# Altium integrated library LEMO Unipole And Multipole Type Connectors.IntLib: 1566 symbols (part 5 of 13) (continued)
## EXA.1B.307.HLN
designator J?
Elbow receptacle for printed circuit with two nuts (solder or screw fixing, back panel mounting), Key (A), 1B series, Multipole Type with 7 Contacts; Manufacturer: LEMO; PartNumber: EXA.1B.307.HLN; Number of contacts: 7; Contact Diameter: 0.7 mm; AWG: 24; Rated Current(A): 6; DatasheetVersion: Jun-14; PackageReference: EXA.1B.307.HLN; PackageDescription: Elbow receptacle for printed circuit with two nuts (solder or screw fixing, back panel mounting), Key(A) for Printed Circuit; Supplier 1: Mouser; Supplier Part Number 1: 736-EXA1B307HLN; Supplier 2: Digi-Key; Supplier Part Number 2: EXA.1B.307.HLN-ND; ComponentLink1Description: Manufacturer URL; ComponentLink1URL: http://www.lemo.com; ComponentLink2Description: Datasheet; ComponentLink2URL: http://intra.lemo.ch/catalog/ROW/UK_English/unipole_multipole.pdf
footprint EXA.1B.307.HLN (Socket, Female, Body 11mm dia. Height 14 mm, Through hole)
pins: 1, 2, 3, 4, 5, 6, 7, 9, 10, 11, 12

## EXA.1B.308.HLN
designator J?
Elbow receptacle for printed circuit with two nuts (solder or screw fixing, back panel mounting), Key (A), 1B series, Multipole Type with 8 Contacts; Manufacturer: LEMO; PartNumber: EXA.1B.308.HLN; Number of contacts: 8; Contact Diameter: 0.7 mm; AWG: 24; Rated Current(A): 2; DatasheetVersion: Jun-14; PackageReference: EXA.1B.308.HLN; PackageDescription: Elbow receptacle for printed circuit with two nuts (solder or screw fixing, back panel mounting), Key(A) for Printed Circuit; Supplier 1: Mouser; Supplier Part Number 1: 736-EXA1B308HLN; Supplier 2: Digi-Key; Supplier Part Number 2: EXA.1B.308.HLN-ND; ComponentLink1Description: Manufacturer URL; ComponentLink1URL: http://www.lemo.com; ComponentLink2Description: Datasheet; ComponentLink2URL: http://intra.lemo.ch/catalog/ROW/UK_English/unipole_multipole.pdf
footprint EXA.1B.308.HLN (Socket, Female, Body 11mm dia. Height 14 mm, Through hole)
pins: 1, 2, 3, 4, 5, 6, 7, 8, 10, 11, 12, 13

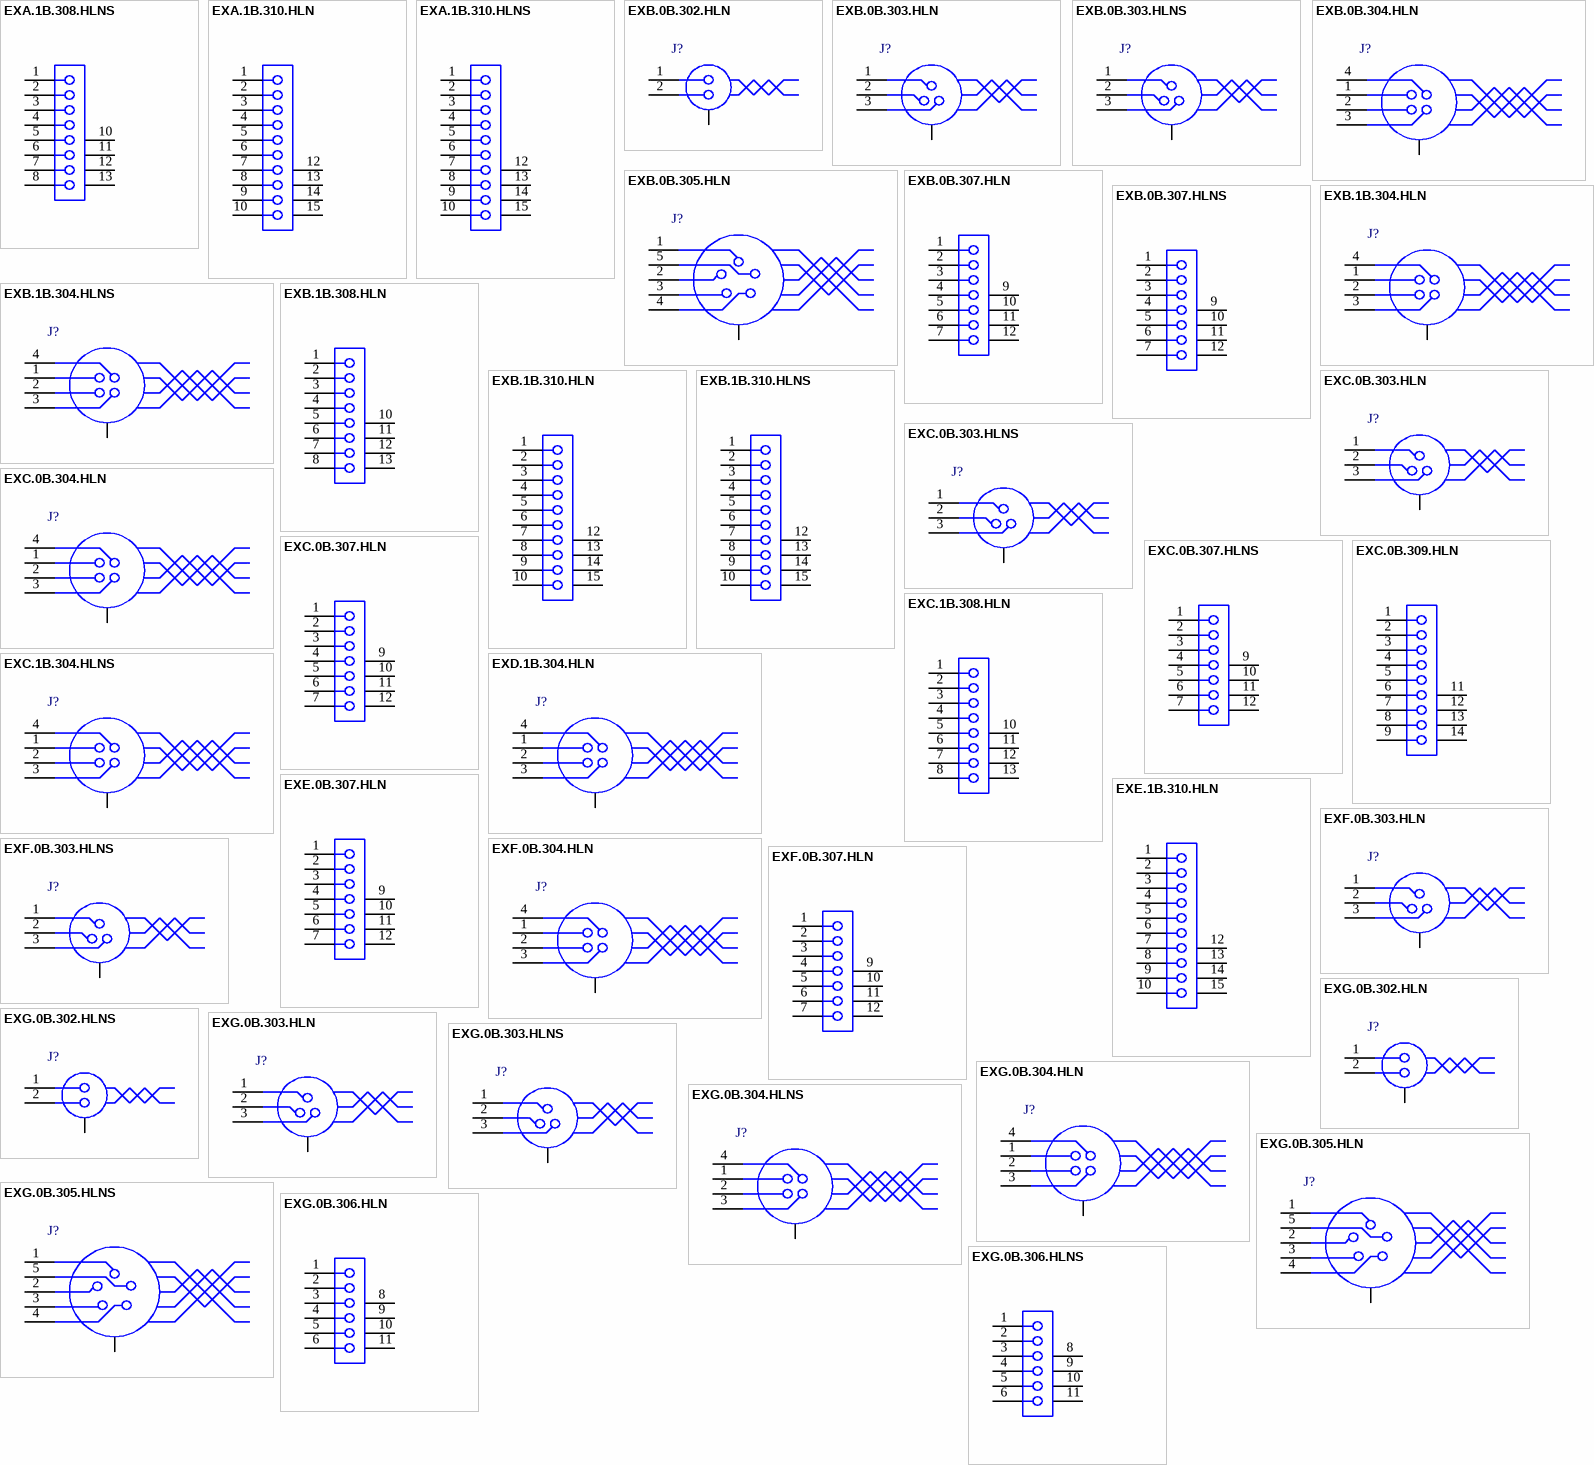
[diagram p16: symbols EXA.1B.308.HLNS to EXG.0B.306.HLNS]

## EXA.1B.308.HLNS
designator J?
Elbow receptacle for printed circuit with two nuts (solder or screw fixing, back panel mounting), Key (A), 1B series, Multipole Type with 8 Contacts; Manufacturer: LEMO; PartNumber: EXA.1B.308.HLNS; Number of contacts: 8; Contact Diameter: 0.7 mm; AWG: 24; Rated Current(A): 2; DatasheetVersion: Jun-14; PackageReference: EXA.1B.308.HLNS; PackageDescription: Elbow receptacle for printed circuit with two nuts (solder or screw fixing, back panel mounting), Key(A) for Printed Circuit; ComponentLink1Description: Manufacturer URL; ComponentLink1URL: http://www.lemo.com; ComponentLink2Description: Datasheet; ComponentLink2URL: http://intra.lemo.ch/catalog/ROW/UK_English/unipole_multipole.pdf
footprint EXA.1B.308.HLNS (Socket, Female, Body 11mm dia. Height 14 mm, Through hole)
pins: 1, 2, 3, 4, 5, 6, 7, 8, 10, 11, 12, 13

## EXA.1B.310.HLN
designator J?
Elbow receptacle for printed circuit with two nuts (solder or screw fixing, back panel mounting), Key (A), 1B series, Multipole Type with 10 Contacts; Manufacturer: LEMO; PartNumber: EXA.1B.310.HLN; Number of contacts: 10; Contact Diameter: 0.5 mm; AWG: 28; Rated Current(A): 1.5.; DatasheetVersion: Jun-14; PackageReference: EXA.1B.310.HLN; PackageDescription: Elbow receptacle for printed circuit with two nuts (solder or screw fixing, back panel mounting), Key(A) for Printed Circuit; ComponentLink1Description: Manufacturer URL; ComponentLink1URL: http://www.lemo.com; ComponentLink2Description: Datasheet; ComponentLink2URL: http://intra.lemo.ch/catalog/ROW/UK_English/unipole_multipole.pdf
footprint EXA.1B.310.HLN (Socket, Female, Body 11mm dia. Height 14 mm, Through hole)
pins: 1, 2, 3, 4, 5, 6, 7, 8, 9, 10, 12, 13, 14, 15

## EXA.1B.310.HLNS
designator J?
Elbow receptacle for printed circuit with two nuts (solder or screw fixing, back panel mounting), Key (A), 1B series, Multipole Type with 10 Contacts; Manufacturer: LEMO; PartNumber: EXA.1B.310.HLNS; Number of contacts: 10; Contact Diameter: 0.5 mm; AWG: 28; Rated Current(A): 1.5.; DatasheetVersion: Jun-14; PackageReference: EXA.1B.310.HLNS; PackageDescription: Elbow receptacle for printed circuit with two nuts (solder or screw fixing, back panel mounting), Key(A) for Printed Circuit; ComponentLink1Description: Manufacturer URL; ComponentLink1URL: http://www.lemo.com; ComponentLink2Description: Datasheet; ComponentLink2URL: http://intra.lemo.ch/catalog/ROW/UK_English/unipole_multipole.pdf
footprint EXA.1B.310.HLNS (Socket, Female, Body 11mm dia. Height 14 mm, Through hole)
pins: 1, 2, 3, 4, 5, 6, 7, 8, 9, 10, 12, 13, 14, 15

## EXB.0B.302.HLN
designator J?
Elbow receptacle for printed circuit with two nuts (solder or screw fixing, back panel mounting), Key (B), 0B series, Multipole Type with 2 Contacts; Manufacturer: LEMO; PartNumber: EXB.0B.302.HLN; Number of contacts: 2; Contact Diameter: 0.9 mm; AWG: 22; Rated Current(A): 6; DatasheetVersion: Jun-14; PackageReference: EXB.0B.302.HLN; PackageDescription: Elbow receptacle for printed circuit with two nuts (solder or screw fixing, back panel mounting), Key(B) for Printed Circuit; Supplier 1: Mouser; Supplier Part Number 1: 736-EXB0B302HLN; Supplier 2: Digi-Key; Supplier Part Number 2: EXB.0B.302.HLN-ND; ComponentLink1Description: Manufacturer URL; ComponentLink1URL: http://www.lemo.com; ComponentLink2Description: Datasheet; ComponentLink2URL: http://intra.lemo.ch/catalog/ROW/UK_English/unipole_multipole.pdf
footprint EXB.0B.302.HLN (Socket, Female, Body 9mm dia. Height 10.5 mm, Through hole)
pins: 1, 2, 4, 5, 6, 7

## EXB.0B.303.HLN
designator J?
Elbow receptacle for printed circuit with two nuts (solder or screw fixing, back panel mounting), Key (B), 0B series, Multipole Type with 3 Contacts; Manufacturer: LEMO; PartNumber: EXB.0B.303.HLN; Number of contacts: 3; Contact Diameter: 0.9 mm; AWG: 22; Rated Current(A): 6; DatasheetVersion: Jun-14; PackageReference: EXB.0B.303.HLN; PackageDescription: Elbow receptacle for printed circuit with two nuts (solder or screw fixing, back panel mounting), Key(B) for Printed Circuit; ComponentLink1Description: Manufacturer URL; ComponentLink1URL: http://www.lemo.com; ComponentLink2Description: Datasheet; ComponentLink2URL: http://intra.lemo.ch/catalog/ROW/UK_English/unipole_multipole.pdf
footprint EXB.0B.303.HLN (Socket, Female, Body 9mm dia. Height 10.5 mm, Through hole)
pins: 1, 2, 3, 5, 6, 7, 8

## EXB.0B.303.HLNS
designator J?
Elbow receptacle for printed circuit with two nuts (solder or screw fixing, back panel mounting), Key (B), 0B series, Multipole Type with 3 Contacts; Manufacturer: LEMO; PartNumber: EXB.0B.303.HLNS; Number of contacts: 3; Contact Diameter: 0.9 mm; AWG: 22; Rated Current(A): 6; DatasheetVersion: Jun-14; PackageReference: EXB.0B.303.HLNS; PackageDescription: Elbow receptacle for printed circuit with two nuts (solder or screw fixing, back panel mounting), Key(B) for Printed Circuit; ComponentLink1Description: Manufacturer URL; ComponentLink1URL: http://www.lemo.com; ComponentLink2Description: Datasheet; ComponentLink2URL: http://intra.lemo.ch/catalog/ROW/UK_English/unipole_multipole.pdf
footprint EXB.0B.303.HLNS (Socket, Female, Body 9mm dia. Height 10.5 mm, Through hole)
pins: 1, 2, 3, 5, 6, 7, 8

## EXB.0B.304.HLN
designator J?
Elbow receptacle for printed circuit with two nuts (solder or screw fixing, back panel mounting), Key (B), 0B series, Multipole Type with 4 Contacts; Manufacturer: LEMO; PartNumber: EXB.0B.304.HLN; Number of contacts: 4; Contact Diameter: 0.7 mm; AWG: 24; Rated Current(A): 6; DatasheetVersion: Jun-14; PackageReference: EXB.0B.304.HLN; PackageDescription: Elbow receptacle for printed circuit with two nuts (solder or screw fixing, back panel mounting), Key(B) for Printed Circuit; Supplier 1: Mouser; Supplier Part Number 1: 736-EXB0B304HLN; Supplier 2: Digi-Key; Supplier Part Number 2: EXB.0B.304.HLN-ND; ComponentLink1Description: Manufacturer URL; ComponentLink1URL: http://www.lemo.com; ComponentLink2Description: Datasheet; ComponentLink2URL: http://intra.lemo.ch/catalog/ROW/UK_English/unipole_multipole.pdf
footprint EXB.0B.304.HLN (Socket, Female, Body 9mm dia. Height 10.5 mm, Through hole)
pins: 1, 2, 3, 4, 6, 7, 8, 9

## EXB.0B.305.HLN
designator J?
Elbow receptacle for printed circuit with two nuts (solder or screw fixing, back panel mounting), Key (B), 0B series, Multipole Type with 5 Contacts; Manufacturer: LEMO; PartNumber: EXB.0B.305.HLN; Number of contacts: 5; Contact Diameter: 0.7 mm; AWG: 24; Rated Current(A): 6; DatasheetVersion: Jun-14; PackageReference: EXB.0B.305.HLN; PackageDescription: Elbow receptacle for printed circuit with two nuts (solder or screw fixing, back panel mounting), Key(B) for Printed Circuit; Supplier 1: Mouser; Supplier Part Number 1: 736-EXB0B305HLN; Supplier 2: Digi-Key; Supplier Part Number 2: EXB.0B.305.HLN-ND; ComponentLink1Description: Manufacturer URL; ComponentLink1URL: http://www.lemo.com; ComponentLink2Description: Datasheet; ComponentLink2URL: http://intra.lemo.ch/catalog/ROW/UK_English/unipole_multipole.pdf
footprint EXB.0B.305.HLN (Socket, Female, Body 9mm dia. Height 10.5 mm, Through hole)
pins: 1, 2, 3, 4, 5, 7, 8, 9, 10

## EXB.0B.307.HLN
designator J?
Elbow receptacle for printed circuit with two nuts (solder or screw fixing, back panel mounting), Key (B), 0B series, Multipole Type with 7 Contacts; Manufacturer: LEMO; PartNumber: EXB.0B.307.HLN; Number of contacts: 7; Contact Diameter: 0.5 mm; AWG: 28; Rated Current(A): 2; DatasheetVersion: Jun-14; PackageReference: EXB.0B.307.HLN; PackageDescription: Elbow receptacle for printed circuit with two nuts (solder or screw fixing, back panel mounting), Key(B) for Printed Circuit; ComponentLink1Description: Manufacturer URL; ComponentLink1URL: http://www.lemo.com; ComponentLink2Description: Datasheet; ComponentLink2URL: http://intra.lemo.ch/catalog/ROW/UK_English/unipole_multipole.pdf
footprint EXB.0B.307.HLN (Socket, Female, Body 9mm dia. Height 10.5 mm, Through hole)
pins: 1, 2, 3, 4, 5, 6, 7, 9, 10, 11, 12

## EXB.0B.307.HLNS
designator J?
Elbow receptacle for printed circuit with two nuts (solder or screw fixing, back panel mounting), Key (B), 0B series, Multipole Type with 7 Contacts; Manufacturer: LEMO; PartNumber: EXB.0B.307.HLNS; Number of contacts: 7; Contact Diameter: 0.5 mm; AWG: 28; Rated Current(A): 2; DatasheetVersion: Jun-14; PackageReference: EXB.0B.307.HLNS; PackageDescription: Elbow receptacle for printed circuit with two nuts (solder or screw fixing, back panel mounting), Key(B) for Printed Circuit; Supplier 1: Mouser; Supplier Part Number 1: 736-EXB0B307HLNS; Supplier 2: Digi-Key; Supplier Part Number 2: EXB.0B.307.HLNS-ND; ComponentLink1Description: Manufacturer URL; ComponentLink1URL: http://www.lemo.com; ComponentLink2Description: Datasheet; ComponentLink2URL: http://intra.lemo.ch/catalog/ROW/UK_English/unipole_multipole.pdf
footprint EXB.0B.307.HLNS (Socket, Female, Body 9mm dia. Height 10.5 mm, Through hole)
pins: 1, 2, 3, 4, 5, 6, 7, 9, 10, 11, 12

## EXB.1B.304.HLN
designator J?
Elbow receptacle for printed circuit with two nuts (solder or screw fixing, back panel mounting), Key (B), 1B series, Multipole Type with 4 Contacts; Manufacturer: LEMO; PartNumber: EXB.1B.304.HLN; Number of contacts: 4; Contact Diameter: 0.9 mm; AWG: 22; Rated Current(A): 6; DatasheetVersion: Jun-14; PackageReference: EXB.1B.304.HLN; PackageDescription: Elbow receptacle for printed circuit with two nuts (solder or screw fixing, back panel mounting), Key(B) for Printed Circuit; Supplier 1: Mouser; Supplier Part Number 1: 736-EXB1B304HLN; Supplier 2: Digi-Key; Supplier Part Number 2: EXB.1B.304.HLN-ND; ComponentLink1Description: Manufacturer URL; ComponentLink1URL: http://www.lemo.com; ComponentLink2Description: Datasheet; ComponentLink2URL: http://intra.lemo.ch/catalog/ROW/UK_English/unipole_multipole.pdf
footprint EXB.1B.304.HLN (Socket, Female, Body 11mm dia. Height 14 mm, Through hole)
pins: 1, 2, 3, 4, 6, 7, 8, 9

## EXB.1B.304.HLNS
designator J?
Elbow receptacle for printed circuit with two nuts (solder or screw fixing, back panel mounting), Key (B), 1B series, Multipole Type with 4 Contacts; Manufacturer: LEMO; PartNumber: EXB.1B.304.HLNS; Number of contacts: 4; Contact Diameter: 0.9 mm; AWG: 22; Rated Current(A): 6; DatasheetVersion: Jun-14; PackageReference: EXB.1B.304.HLNS; PackageDescription: Elbow receptacle for printed circuit with two nuts (solder or screw fixing, back panel mounting), Key(B) for Printed Circuit; ComponentLink1Description: Manufacturer URL; ComponentLink1URL: http://www.lemo.com; ComponentLink2Description: Datasheet; ComponentLink2URL: http://intra.lemo.ch/catalog/ROW/UK_English/unipole_multipole.pdf
footprint EXB.1B.304.HLNS (Socket, Female, Body 11mm dia. Height 14 mm, Through hole)
pins: 1, 2, 3, 4, 6, 7, 8, 9

## EXB.1B.308.HLN
designator J?
Elbow receptacle for printed circuit with two nuts (solder or screw fixing, back panel mounting), Key (B), 1B series, Multipole Type with 8 Contacts; Manufacturer: LEMO; PartNumber: EXB.1B.308.HLN; Number of contacts: 8; Contact Diameter: 0.7 mm; AWG: 24; Rated Current(A): 2; DatasheetVersion: Jun-14; PackageReference: EXB.1B.308.HLN; PackageDescription: Elbow receptacle for printed circuit with two nuts (solder or screw fixing, back panel mounting), Key(B) for Printed Circuit; Supplier 1: Mouser; Supplier Part Number 1: 736-EXB1B308HLN; Supplier 2: Digi-Key; Supplier Part Number 2: EXB.1B.308.HLN-ND; ComponentLink1Description: Manufacturer URL; ComponentLink1URL: http://www.lemo.com; ComponentLink2Description: Datasheet; ComponentLink2URL: http://intra.lemo.ch/catalog/ROW/UK_English/unipole_multipole.pdf
footprint EXB.1B.308.HLN (Socket, Female, Body 11mm dia. Height 14 mm, Through hole)
pins: 1, 2, 3, 4, 5, 6, 7, 8, 10, 11, 12, 13

## EXB.1B.310.HLN
designator J?
Elbow receptacle for printed circuit with two nuts (solder or screw fixing, back panel mounting), Key (B), 1B series, Multipole Type with 10 Contacts; Manufacturer: LEMO; PartNumber: EXB.1B.310.HLN; Number of contacts: 10; Contact Diameter: 0.5 mm; AWG: 28; Rated Current(A): 1.5.; DatasheetVersion: Jun-14; PackageReference: EXB.1B.310.HLN; PackageDescription: Elbow receptacle for printed circuit with two nuts (solder or screw fixing, back panel mounting), Key(B) for Printed Circuit; ComponentLink1Description: Manufacturer URL; ComponentLink1URL: http://www.lemo.com; ComponentLink2Description: Datasheet; ComponentLink2URL: http://intra.lemo.ch/catalog/ROW/UK_English/unipole_multipole.pdf
footprint EXB.1B.310.HLN (Socket, Female, Body 11mm dia. Height 14 mm, Through hole)
pins: 1, 2, 3, 4, 5, 6, 7, 8, 9, 10, 12, 13, 14, 15

## EXB.1B.310.HLNS
designator J?
Elbow receptacle for printed circuit with two nuts (solder or screw fixing, back panel mounting), Key (B), 1B series, Multipole Type with 10 Contacts; Manufacturer: LEMO; PartNumber: EXB.1B.310.HLNS; Number of contacts: 10; Contact Diameter: 0.5 mm; AWG: 28; Rated Current(A): 1.5.; DatasheetVersion: Jun-14; PackageReference: EXB.1B.310.HLNS; PackageDescription: Elbow receptacle for printed circuit with two nuts (solder or screw fixing, back panel mounting), Key(B) for Printed Circuit; ComponentLink1Description: Manufacturer URL; ComponentLink1URL: http://www.lemo.com; ComponentLink2Description: Datasheet; ComponentLink2URL: http://intra.lemo.ch/catalog/ROW/UK_English/unipole_multipole.pdf
footprint EXB.1B.310.HLNS (Socket, Female, Body 11mm dia. Height 14 mm, Through hole)
pins: 1, 2, 3, 4, 5, 6, 7, 8, 9, 10, 12, 13, 14, 15

## EXC.0B.303.HLN
designator J?
Elbow receptacle for printed circuit with two nuts (solder or screw fixing, back panel mounting), Key (C), 0B series, Multipole Type with 3 Contacts; Manufacturer: LEMO; PartNumber: EXC.0B.303.HLN; Number of contacts: 3; Contact Diameter: 0.9 mm; AWG: 22; Rated Current(A): 6; DatasheetVersion: Jun-14; PackageReference: EXC.0B.303.HLN; PackageDescription: Elbow receptacle for printed circuit with two nuts (solder or screw fixing, back panel mounting), Key(C) for Printed Circuit; ComponentLink1Description: Manufacturer URL; ComponentLink1URL: http://www.lemo.com; ComponentLink2Description: Datasheet; ComponentLink2URL: http://intra.lemo.ch/catalog/ROW/UK_English/unipole_multipole.pdf
footprint EXC.0B.303.HLN (Socket, Female, Body 9mm dia. Height 10.5 mm, Through hole)
pins: 1, 2, 3, 5, 6, 7, 8

## EXC.0B.303.HLNS
designator J?
Elbow receptacle for printed circuit with two nuts (solder or screw fixing, back panel mounting), Key (C), 0B series, Multipole Type with 3 Contacts; Manufacturer: LEMO; PartNumber: EXC.0B.303.HLNS; Number of contacts: 3; Contact Diameter: 0.9 mm; AWG: 22; Rated Current(A): 6; DatasheetVersion: Jun-14; PackageReference: EXC.0B.303.HLNS; PackageDescription: Elbow receptacle for printed circuit with two nuts (solder or screw fixing, back panel mounting), Key(C) for Printed Circuit; ComponentLink1Description: Manufacturer URL; ComponentLink1URL: http://www.lemo.com; ComponentLink2Description: Datasheet; ComponentLink2URL: http://intra.lemo.ch/catalog/ROW/UK_English/unipole_multipole.pdf
footprint EXC.0B.303.HLNS (Socket, Female, Body 9mm dia. Height 10.5 mm, Through hole)
pins: 1, 2, 3, 5, 6, 7, 8

## EXC.0B.304.HLN
designator J?
Elbow receptacle for printed circuit with two nuts (solder or screw fixing, back panel mounting), Key (C), 0B series, Multipole Type with 4 Contacts; Manufacturer: LEMO; PartNumber: EXC.0B.304.HLN; Number of contacts: 4; Contact Diameter: 0.7 mm; AWG: 24; Rated Current(A): 6; DatasheetVersion: Jun-14; PackageReference: EXC.0B.304.HLN; PackageDescription: Elbow receptacle for printed circuit with two nuts (solder or screw fixing, back panel mounting), Key(C) for Printed Circuit; Supplier 1: Mouser; Supplier Part Number 1: 736-EXC0B304HLN; Supplier 2: Digi-Key; Supplier Part Number 2: EXC.0B.304.HLN-ND; ComponentLink1Description: Manufacturer URL; ComponentLink1URL: http://www.lemo.com; ComponentLink2Description: Datasheet; ComponentLink2URL: http://intra.lemo.ch/catalog/ROW/UK_English/unipole_multipole.pdf
footprint EXC.0B.304.HLN (Socket, Female, Body 9mm dia. Height 10.5 mm, Through hole)
pins: 1, 2, 3, 4, 6, 7, 8, 9

## EXC.0B.307.HLN
designator J?
Elbow receptacle for printed circuit with two nuts (solder or screw fixing, back panel mounting), Key (C), 0B series, Multipole Type with 7 Contacts; Manufacturer: LEMO; PartNumber: EXC.0B.307.HLN; Number of contacts: 7; Contact Diameter: 0.5 mm; AWG: 28; Rated Current(A): 2; DatasheetVersion: Jun-14; PackageReference: EXC.0B.307.HLN; PackageDescription: Elbow receptacle for printed circuit with two nuts (solder or screw fixing, back panel mounting), Key(C) for Printed Circuit; ComponentLink1Description: Manufacturer URL; ComponentLink1URL: http://www.lemo.com; ComponentLink2Description: Datasheet; ComponentLink2URL: http://intra.lemo.ch/catalog/ROW/UK_English/unipole_multipole.pdf
footprint EXC.0B.307.HLN (Socket, Female, Body 9mm dia. Height 10.5 mm, Through hole)
pins: 1, 2, 3, 4, 5, 6, 7, 9, 10, 11, 12

## EXC.0B.307.HLNS
designator J?
Elbow receptacle for printed circuit with two nuts (solder or screw fixing, back panel mounting), Key (C), 0B series, Multipole Type with 7 Contacts; Manufacturer: LEMO; PartNumber: EXC.0B.307.HLNS; Number of contacts: 7; Contact Diameter: 0.5 mm; AWG: 28; Rated Current(A): 2; DatasheetVersion: Jun-14; PackageReference: EXC.0B.307.HLNS; PackageDescription: Elbow receptacle for printed circuit with two nuts (solder or screw fixing, back panel mounting), Key(C) for Printed Circuit; ComponentLink1Description: Manufacturer URL; ComponentLink1URL: http://www.lemo.com; ComponentLink2Description: Datasheet; ComponentLink2URL: http://intra.lemo.ch/catalog/ROW/UK_English/unipole_multipole.pdf
footprint EXC.0B.307.HLNS (Socket, Female, Body 9mm dia. Height 10.5 mm, Through hole)
pins: 1, 2, 3, 4, 5, 6, 7, 9, 10, 11, 12

## EXC.0B.309.HLN
designator J?
Elbow receptacle for printed circuit with two nuts (solder or screw fixing, back panel mounting), Key (C), 0B series, Multipole Type with 9 Contacts; Manufacturer: LEMO; PartNumber: EXC.0B.309.HLN; Number of contacts: 9; Contact Diameter: 0.5 mm; AWG: 28; Rated Current(A): 1.5.; DatasheetVersion: Jun-14; PackageReference: EXC.0B.309.HLN; PackageDescription: Elbow receptacle for printed circuit with two nuts (solder or screw fixing, back panel mounting), Key(C) for Printed Circuit; ComponentLink1Description: Manufacturer URL; ComponentLink1URL: http://www.lemo.com; ComponentLink2Description: Datasheet; ComponentLink2URL: http://intra.lemo.ch/catalog/ROW/UK_English/unipole_multipole.pdf
footprint EXC.0B.309.HLN (Socket, Female, Body 9mm dia. Height 10.5 mm, Through hole)
pins: 1, 2, 3, 4, 5, 6, 7, 8, 9, 11, 12, 13, 14

## EXC.1B.304.HLNS
designator J?
Elbow receptacle for printed circuit with two nuts (solder or screw fixing, back panel mounting), Key (C), 1B series, Multipole Type with 4 Contacts; Manufacturer: LEMO; PartNumber: EXC.1B.304.HLNS; Number of contacts: 4; Contact Diameter: 0.9 mm; AWG: 22; Rated Current(A): 6; DatasheetVersion: Jun-14; PackageReference: EXC.1B.304.HLNS; PackageDescription: Elbow receptacle for printed circuit with two nuts (solder or screw fixing, back panel mounting), Key(C) for Printed Circuit; ComponentLink1Description: Manufacturer URL; ComponentLink1URL: http://www.lemo.com; ComponentLink2Description: Datasheet; ComponentLink2URL: http://intra.lemo.ch/catalog/ROW/UK_English/unipole_multipole.pdf
footprint EXC.1B.304.HLNS (Socket, Female, Body 11mm dia. Height 14 mm, Through hole)
pins: 1, 2, 3, 4, 6, 7, 8, 9

## EXC.1B.308.HLN
designator J?
Elbow receptacle for printed circuit with two nuts (solder or screw fixing, back panel mounting), Key (C), 1B series, Multipole Type with 8 Contacts; Manufacturer: LEMO; PartNumber: EXC.1B.308.HLN; Number of contacts: 8; Contact Diameter: 0.7 mm; AWG: 24; Rated Current(A): 2; DatasheetVersion: Jun-14; PackageReference: EXC.1B.308.HLN; PackageDescription: Elbow receptacle for printed circuit with two nuts (solder or screw fixing, back panel mounting), Key(C) for Printed Circuit; Supplier 1: Mouser; Supplier Part Number 1: 736-EXC1B308HLN; Supplier 2: Digi-Key; Supplier Part Number 2: EXC.1B.308.HLN-ND; ComponentLink1Description: Manufacturer URL; ComponentLink1URL: http://www.lemo.com; ComponentLink2Description: Datasheet; ComponentLink2URL: http://intra.lemo.ch/catalog/ROW/UK_English/unipole_multipole.pdf
footprint EXC.1B.308.HLN (Socket, Female, Body 11mm dia. Height 14 mm, Through hole)
pins: 1, 2, 3, 4, 5, 6, 7, 8, 10, 11, 12, 13

## EXD.1B.304.HLN
designator J?
Elbow receptacle for printed circuit with two nuts (solder or screw fixing, back panel mounting), Key (D), 1B series, Multipole Type with 4 Contacts; Manufacturer: LEMO; PartNumber: EXD.1B.304.HLN; Number of contacts: 4; Contact Diameter: 0.9 mm; AWG: 22; Rated Current(A): 6; DatasheetVersion: Jun-14; PackageReference: EXD.1B.304.HLN; PackageDescription: Elbow receptacle for printed circuit with two nuts (solder or screw fixing, back panel mounting), Key(D) for Printed Circuit; ComponentLink1Description: Manufacturer URL; ComponentLink1URL: http://www.lemo.com; ComponentLink2Description: Datasheet; ComponentLink2URL: http://intra.lemo.ch/catalog/ROW/UK_English/unipole_multipole.pdf
footprint EXD.1B.304.HLN (Socket, Female, Body 11mm dia. Height 14 mm, Through hole)
pins: 1, 2, 3, 4, 6, 7, 8, 9

## EXE.0B.307.HLN
designator J?
Elbow receptacle for printed circuit with two nuts (solder or screw fixing, back panel mounting), Key (E), 0B series, Multipole Type with 7 Contacts; Manufacturer: LEMO; PartNumber: EXE.0B.307.HLN; Number of contacts: 7; Contact Diameter: 0.5 mm; AWG: 28; Rated Current(A): 2; DatasheetVersion: Jun-14; PackageReference: EXE.0B.307.HLN; PackageDescription: Elbow receptacle for printed circuit with two nuts (solder or screw fixing, back panel mounting), Key(E) for Printed Circuit; ComponentLink1Description: Manufacturer URL; ComponentLink1URL: http://www.lemo.com; ComponentLink2Description: Datasheet; ComponentLink2URL: http://intra.lemo.ch/catalog/ROW/UK_English/unipole_multipole.pdf
footprint EXE.0B.307.HLN (Socket, Female, Body 9mm dia. Height 10.5 mm, Through hole)
pins: 1, 2, 3, 4, 5, 6, 7, 9, 10, 11, 12

## EXE.1B.310.HLN
designator J?
Elbow receptacle for printed circuit with two nuts (solder or screw fixing, back panel mounting), Key (E), 1B series, Multipole Type with 10 Contacts; Manufacturer: LEMO; PartNumber: EXE.1B.310.HLN; Number of contacts: 10; Contact Diameter: 0.5 mm; AWG: 28; Rated Current(A): 1.5.; DatasheetVersion: Jun-14; PackageReference: EXE.1B.310.HLN; PackageDescription: Elbow receptacle for printed circuit with two nuts (solder or screw fixing, back panel mounting), Key(E) for Printed Circuit; ComponentLink1Description: Manufacturer URL; ComponentLink1URL: http://www.lemo.com; ComponentLink2Description: Datasheet; ComponentLink2URL: http://intra.lemo.ch/catalog/ROW/UK_English/unipole_multipole.pdf
footprint EXE.1B.310.HLN (Socket, Female, Body 11mm dia. Height 14 mm, Through hole)
pins: 1, 2, 3, 4, 5, 6, 7, 8, 9, 10, 12, 13, 14, 15

## EXF.0B.303.HLN
designator J?
Elbow receptacle for printed circuit with two nuts (solder or screw fixing, back panel mounting), Key (F), 0B series, Multipole Type with 3 Contacts; Manufacturer: LEMO; PartNumber: EXF.0B.303.HLN; Number of contacts: 3; Contact Diameter: 0.9 mm; AWG: 22; Rated Current(A): 6; DatasheetVersion: Jun-14; PackageReference: EXF.0B.303.HLN; PackageDescription: Elbow receptacle for printed circuit with two nuts (solder or screw fixing, back panel mounting), Key(F) for Printed Circuit; ComponentLink1Description: Manufacturer URL; ComponentLink1URL: http://www.lemo.com; ComponentLink2Description: Datasheet; ComponentLink2URL: http://intra.lemo.ch/catalog/ROW/UK_English/unipole_multipole.pdf
footprint EXF.0B.303.HLN (Socket, Female, Body 9mm dia. Height 10.5 mm, Through hole)
pins: 1, 2, 3, 5, 6, 7, 8

## EXF.0B.303.HLNS
designator J?
Elbow receptacle for printed circuit with two nuts (solder or screw fixing, back panel mounting), Key (F), 0B series, Multipole Type with 3 Contacts; Manufacturer: LEMO; PartNumber: EXF.0B.303.HLNS; Number of contacts: 3; Contact Diameter: 0.9 mm; AWG: 22; Rated Current(A): 6; DatasheetVersion: Jun-14; PackageReference: EXF.0B.303.HLNS; PackageDescription: Elbow receptacle for printed circuit with two nuts (solder or screw fixing, back panel mounting), Key(F) for Printed Circuit; ComponentLink1Description: Manufacturer URL; ComponentLink1URL: http://www.lemo.com; ComponentLink2Description: Datasheet; ComponentLink2URL: http://intra.lemo.ch/catalog/ROW/UK_English/unipole_multipole.pdf
footprint EXF.0B.303.HLNS (Socket, Female, Body 9mm dia. Height 10.5 mm, Through hole)
pins: 1, 2, 3, 5, 6, 7, 8

## EXF.0B.304.HLN
designator J?
Elbow receptacle for printed circuit with two nuts (solder or screw fixing, back panel mounting), Key (F), 0B series, Multipole Type with 4 Contacts; Manufacturer: LEMO; PartNumber: EXF.0B.304.HLN; Number of contacts: 4; Contact Diameter: 0.7 mm; AWG: 24; Rated Current(A): 6; DatasheetVersion: Jun-14; PackageReference: EXF.0B.304.HLN; PackageDescription: Elbow receptacle for printed circuit with two nuts (solder or screw fixing, back panel mounting), Key(F) for Printed Circuit; ComponentLink1Description: Manufacturer URL; ComponentLink1URL: http://www.lemo.com; ComponentLink2Description: Datasheet; ComponentLink2URL: http://intra.lemo.ch/catalog/ROW/UK_English/unipole_multipole.pdf
footprint EXF.0B.304.HLN (Socket, Female, Body 9mm dia. Height 10.5 mm, Through hole)
pins: 1, 2, 3, 4, 6, 7, 8, 9

## EXF.0B.307.HLN
designator J?
Elbow receptacle for printed circuit with two nuts (solder or screw fixing, back panel mounting), Key (F), 0B series, Multipole Type with 7 Contacts; Manufacturer: LEMO; PartNumber: EXF.0B.307.HLN; Number of contacts: 7; Contact Diameter: 0.5 mm; AWG: 28; Rated Current(A): 2; DatasheetVersion: Jun-14; PackageReference: EXF.0B.307.HLN; PackageDescription: Elbow receptacle for printed circuit with two nuts (solder or screw fixing, back panel mounting), Key(F) for Printed Circuit; ComponentLink1Description: Manufacturer URL; ComponentLink1URL: http://www.lemo.com; ComponentLink2Description: Datasheet; ComponentLink2URL: http://intra.lemo.ch/catalog/ROW/UK_English/unipole_multipole.pdf
footprint EXF.0B.307.HLN (Socket, Female, Body 9mm dia. Height 10.5 mm, Through hole)
pins: 1, 2, 3, 4, 5, 6, 7, 9, 10, 11, 12

## EXG.0B.302.HLN
designator J?
Elbow receptacle for printed circuit with two nuts (solder or screw fixing, back panel mounting), Key (G), 0B series, Multipole Type with 2 Contacts; Manufacturer: LEMO; PartNumber: EXG.0B.302.HLN; Number of contacts: 2; Contact Diameter: 0.9 mm; AWG: 22; Rated Current(A): 6; DatasheetVersion: Jun-14; PackageReference: EXG.0B.302.HLN; PackageDescription: Elbow receptacle for printed circuit with two nuts (solder or screw fixing, back panel mounting), Key(G) for Printed Circuit; Supplier 1: Mouser; Supplier Part Number 1: 736-EXG0B302HLN; Supplier 2: Newark; Supplier Part Number 2: 12R0313; Supplier 3: Digi-Key; Supplier Part Number 3: 1124-1425-ND; ComponentLink1Description: Manufacturer URL; ComponentLink1URL: http://www.lemo.com; ComponentLink2Description: Datasheet; ComponentLink2URL: http://intra.lemo.ch/catalog/ROW/UK_English/unipole_multipole.pdf
footprint EXG.0B.302.HLN (Socket, Female, Body 9mm dia. Height 10.5 mm, Through hole)
pins: 1, 2, 4, 5, 6, 7

## EXG.0B.302.HLNS
designator J?
Elbow receptacle for printed circuit with two nuts (solder or screw fixing, back panel mounting), Key (G), 0B series, Multipole Type with 2 Contacts; Manufacturer: LEMO; PartNumber: EXG.0B.302.HLNS; Number of contacts: 2; Contact Diameter: 0.9 mm; AWG: 22; Rated Current(A): 6; DatasheetVersion: Jun-14; PackageReference: EXG.0B.302.HLNS; PackageDescription: Elbow receptacle for printed circuit with two nuts (solder or screw fixing, back panel mounting), Key(G) for Printed Circuit; Supplier 1: Mouser; Supplier Part Number 1: 736-EXG0B302HLNS; Supplier 2: Digi-Key; Supplier Part Number 2: EXG.0B.302.HLNS-ND; ComponentLink1Description: Manufacturer URL; ComponentLink1URL: http://www.lemo.com; ComponentLink2Description: Datasheet; ComponentLink2URL: http://intra.lemo.ch/catalog/ROW/UK_English/unipole_multipole.pdf
footprint EXG.0B.302.HLNS (Socket, Female, Body 9mm dia. Height 10.5 mm, Through hole)
pins: 1, 2, 4, 5, 6, 7

## EXG.0B.303.HLN
designator J?
Elbow receptacle for printed circuit with two nuts (solder or screw fixing, back panel mounting), Key (G), 0B series, Multipole Type with 3 Contacts; Manufacturer: LEMO; PartNumber: EXG.0B.303.HLN; Number of contacts: 3; Contact Diameter: 0.9 mm; AWG: 22; Rated Current(A): 6; DatasheetVersion: Jun-14; PackageReference: EXG.0B.303.HLN; PackageDescription: Elbow receptacle for printed circuit with two nuts (solder or screw fixing, back panel mounting), Key(G) for Printed Circuit; Supplier 1: Mouser; Supplier Part Number 1: 736-EXG.0B303.HLN; Supplier 2: Digi-Key; Supplier Part Number 2: EXG.0B.303.HLN-ND; ComponentLink1Description: Manufacturer URL; ComponentLink1URL: http://www.lemo.com; ComponentLink2Description: Datasheet; ComponentLink2URL: http://intra.lemo.ch/catalog/ROW/UK_English/unipole_multipole.pdf
footprint EXG.0B.303.HLN (Socket, Female, Body 9mm dia. Height 10.5 mm, Through hole)
pins: 1, 2, 3, 5, 6, 7, 8

## EXG.0B.303.HLNS
designator J?
Elbow receptacle for printed circuit with two nuts (solder or screw fixing, back panel mounting), Key (G), 0B series, Multipole Type with 3 Contacts; Manufacturer: LEMO; PartNumber: EXG.0B.303.HLNS; Number of contacts: 3; Contact Diameter: 0.9 mm; AWG: 22; Rated Current(A): 6; DatasheetVersion: Jun-14; PackageReference: EXG.0B.303.HLNS; PackageDescription: Elbow receptacle for printed circuit with two nuts (solder or screw fixing, back panel mounting), Key(G) for Printed Circuit; ComponentLink1Description: Manufacturer URL; ComponentLink1URL: http://www.lemo.com; ComponentLink2Description: Datasheet; ComponentLink2URL: http://intra.lemo.ch/catalog/ROW/UK_English/unipole_multipole.pdf
footprint EXG.0B.303.HLNS (Socket, Female, Body 9mm dia. Height 10.5 mm, Through hole)
pins: 1, 2, 3, 5, 6, 7, 8